# Altium footprint library ST封装.PcbLib: 1336 footprints (part 90 of 109) (continued)
## SQFP40X40-512(T) [mm] (continued)
  oval 1.6x0.2 smd: 65(-20.55,-1.65) 66(-20.55,-1.95) 67(-20.55,-2.25) 68(-20.55,-2.55) 69(-20.55,-2.85) 70(-20.55,-3.15) 71(-20.55,-3.45) 72(-20.55,-3.75) 73(-20.55,-4.05) 74(-20.55,-4.35) 75(-20.55,-4.65) 76(-20.55,-4.95) 77(-20.55,-5.25) 78(-20.55,-5.55) 79(-20.55,-5.85) 80(-20.55,-6.15) 81(-20.55,-6.45) 82(-20.55,-6.75) 83(-20.55,-7.05) 84(-20.55,-7.35) 85(-20.55,-7.65) 86(-20.55,-7.95) 87(-20.55,-8.25) 88(-20.55,-8.55) 89(-20.55,-8.85) 90(-20.55,-9.15) 91(-20.55,-9.45) 92(-20.55,-9.75) 93(-20.55,-10.05) 94(-20.55,-10.35) 95(-20.55,-10.65) 96(-20.55,-10.95) 97(-20.55,-11.25) 98(-20.55,-11.55) 99(-20.55,-11.85) 100(-20.55,-12.15) 101(-20.55,-12.45) 102(-20.55,-12.75) 103(-20.55,-13.05) 104(-20.55,-13.35) 105(-20.55,-13.65) 106(-20.55,-13.95) 107(-20.55,-14.25) 108(-20.55,-14.55) 109(-20.55,-14.85) 110(-20.55,-15.15) 111(-20.55,-15.45) 112(-20.55,-15.75) 113(-20.55,-16.05) 114(-20.55,-16.35) 115(-20.55,-16.65) 116(-20.55,-16.95) 117(-20.55,-17.25) 118(-20.55,-17.55) 119(-20.55,-17.85) 120(-20.55,-18.15) 121(-20.55,-18.45) 122(-20.55,-18.75) 123(-20.55,-19.05) 124(-20.55,-19.35) 125(-20.55,-19.65) 126(-20.55,-19.95) 127(-20.55,-20.25) 128(-20.55,-20.55) 129(-20.55,-20.85) 130(-20.55,-21.15) 131(-20.55,-21.45) 132(-20.55,-21.75) 133(-20.55,-22.05) 134(-20.55,-22.35) 135(-20.55,-22.65) 136(-20.55,-22.95) 137(-20.55,-23.25) 138(-20.55,-23.55) 139(-20.55,-23.85) 140(-20.55,-24.15) 141(-20.55,-24.45) 142(-20.55,-24.75) 143(-20.55,-25.05) 144(-20.55,-25.35) 145(-20.55,-25.65) 146(-20.55,-25.95) 147(-20.55,-26.25) 148(-20.55,-26.55) 149(-20.55,-26.85) 150(-20.55,-27.15) 151(-20.55,-27.45) 152(-20.55,-27.75) 153(-20.55,-28.05) 154(-20.55,-28.35) 155(-20.55,-28.65) 156(-20.55,-28.95) 157(-20.55,-29.25) 158(-20.55,-29.55) 159(-20.55,-29.85) 160(-20.55,-30.15) 161(-20.55,-30.45) 162(-20.55,-30.75) 163(-20.55,-31.05) 164(-20.55,-31.35) 165(-20.55,-31.65) 166(-20.55,-31.95) 167(-20.55,-32.25) 168(-20.55,-32.55) 169(-20.55,-32.85) 170(-20.55,-33.15) 171(-20.55,-33.45) 172(-20.55,-33.75) 173(-20.55,-34.05) 174(-20.55,-34.35) 175(-20.55,-34.65) 176(-20.55,-34.95) 177(-20.55,-35.25) 178(-20.55,-35.55) 179(-20.55,-35.85) 180(-20.55,-36.15) 181(-20.55,-36.45) 182(-20.55,-36.75) 183(-20.55,-37.05) 184(-20.55,-37.35) 185(-20.55,-37.65) 186(-20.55,-37.95) 187(-20.55,-38.25) 188(-20.55,-38.55) 189(-20.55,-38.85) 190(-20.55,-39.15) 191(-20.55,-39.45) 192(-20.55,-39.75) 321(20.85,-39.75) 322(20.85,-39.45) 323(20.85,-39.15) 324(20.85,-38.85) 325(20.85,-38.55) 326(20.85,-38.25) 327(20.85,-37.95) 328(20.85,-37.65) 329(20.85,-37.35) 330(20.85,-37.05) 331(20.85,-36.75) 332(20.85,-36.45) 333(20.85,-36.15) 334(20.85,-35.85) 335(20.85,-35.55) 336(20.85,-35.25) 337(20.85,-34.95) 338(20.85,-34.65) 339(20.85,-34.35) 340(20.85,-34.05) 341(20.85,-33.75) 342(20.85,-33.45) 343(20.85,-33.15) 344(20.85,-32.85) 345(20.85,-32.55) 346(20.85,-32.25) 347(20.85,-31.95) 348(20.85,-31.65) 349(20.85,-31.35) 350(20.85,-31.05) 351(20.85,-30.75) 352(20.85,-30.45) 353(20.85,-30.15) 354(20.85,-29.85) 355(20.85,-29.55) 356(20.85,-29.25) 357(20.85,-28.95) 358(20.85,-28.65) 359(20.85,-28.35) 360(20.85,-28.05) 361(20.85,-27.75) 362(20.85,-27.45) 363(20.85,-27.15) 364(20.85,-26.85) 365(20.85,-26.55) 366(20.85,-26.25) 367(20.85,-25.95) 368(20.85,-25.65) 369(20.85,-25.35) 370(20.85,-25.05) 371(20.85,-24.75) 372(20.85,-24.45) 373(20.85,-24.15) 374(20.85,-23.85) 375(20.85,-23.55) 376(20.85,-23.25) 377(20.85,-22.95) 378(20.85,-22.65) 379(20.85,-22.35) 380(20.85,-22.05) 381(20.85,-21.75) 382(20.85,-21.45) 383(20.85,-21.15) 384(20.85,-20.85) 385(20.85,-20.55) 386(20.85,-20.25) 387(20.85,-19.95) 388(20.85,-19.65) 389(20.85,-19.35) 390(20.85,-19.05) 391(20.85,-18.75) 392(20.85,-18.45) 393(20.85,-18.15) 394(20.85,-17.85) 395(20.85,-17.55) 396(20.85,-17.25) 397(20.85,-16.95) 398(20.85,-16.65) 399(20.85,-16.35) 400(20.85,-16.05) 401(20.85,-15.75) 402(20.85,-15.45) 403(20.85,-15.15) 404(20.85,-14.85) 405(20.85,-14.55) 406(20.85,-14.25) 407(20.85,-13.95) 408(20.85,-13.65) 409(20.85,-13.35) 410(20.85,-13.05) 411(20.85,-12.75) 412(20.85,-12.45) 413(20.85,-12.15) 414(20.85,-11.85) 415(20.85,-11.55) 416(20.85,-11.25) 417(20.85,-10.95) 418(20.85,-10.65) 419(20.85,-10.35) 420(20.85,-10.05) 421(20.85,-9.75) 422(20.85,-9.45) 423(20.85,-9.15) 424(20.85,-8.85) 425(20.85,-8.55) 426(20.85,-8.25) 427(20.85,-7.95) 428(20.85,-7.65) 429(20.85,-7.35) 430(20.85,-7.05) 431(20.85,-6.75) 432(20.85,-6.45) 433(20.85,-6.15) 434(20.85,-5.85) 435(20.85,-5.55) 436(20.85,-5.25) 437(20.85,-4.95) 438(20.85,-4.65) 439(20.85,-4.35) 440(20.85,-4.05) 441(20.85,-3.75) 442(20.85,-3.45) 443(20.85,-3.15) 444(20.85,-2.85) 445(20.85,-2.55) 446(20.85,-2.25) 447(20.85,-1.95) 448(20.85,-1.65)
Top Overlay:
  lines w0.2: -20.95,-40.35 -20.95,-41.8 -19.5,-41.8 ; -20.95,-1.05 -20.95,-0.4 -20.15,0.4 -19.5,0.4 ; 19.8,-41.8 21.25,-41.8 21.25,-40.35 ; 19.8,0.4 21.25,0.4 21.25,-1.05

## SQFP40X40-520(N) [mm]
pads (520):
  rect 1.6x0.2 smd: 1(0,0)
  oval 1.6x0.2 smd: 2(0,-0.3) 3(0,-0.6) 4(0,-0.9) 5(0,-1.2) 6(0,-1.5) 7(0,-1.8) 8(0,-2.1) 9(0,-2.4) 10(0,-2.7) 11(0,-3) 12(0,-3.3) 13(0,-3.6) 14(0,-3.9) 15(0,-4.2) 16(0,-4.5) 17(0,-4.8) 18(0,-5.1) 19(0,-5.4) 20(0,-5.7) 21(0,-6) 22(0,-6.3) 23(0,-6.6) 24(0,-6.9) 25(0,-7.2) 26(0,-7.5) 27(0,-7.8) 28(0,-8.1) 29(0,-8.4) 30(0,-8.7) 31(0,-9) 32(0,-9.3) 33(0,-9.6) 34(0,-9.9) 35(0,-10.2) 36(0,-10.5) 37(0,-10.8) 38(0,-11.1) 39(0,-11.4) 40(0,-11.7) 41(0,-12) 42(0,-12.3) 43(0,-12.6) 44(0,-12.9) 45(0,-13.2) 46(0,-13.5) 47(0,-13.8) 48(0,-14.1) 49(0,-14.4) 50(0,-14.7) 51(0,-15) 52(0,-15.3) 53(0,-15.6) 54(0,-15.9) 55(0,-16.2) 56(0,-16.5) 57(0,-16.8) 58(0,-17.1) 59(0,-17.4) 60(0,-17.7) 61(0,-18) 62(0,-18.3) 63(0,-18.6) 64(0,-18.9) 65(0,-19.2) 66(0,-19.5) 67(0,-19.8) 68(0,-20.1) 69(0,-20.4) 70(0,-20.7) 71(0,-21) 72(0,-21.3) 73(0,-21.6) 74(0,-21.9) 75(0,-22.2) 76(0,-22.5) 77(0,-22.8) 78(0,-23.1) 79(0,-23.4) 80(0,-23.7) 81(0,-24) 82(0,-24.3) 83(0,-24.6) 84(0,-24.9) 85(0,-25.2) 86(0,-25.5) 87(0,-25.8) 88(0,-26.1) 89(0,-26.4) 90(0,-26.7) 91(0,-27) 92(0,-27.3) 93(0,-27.6) 94(0,-27.9) 95(0,-28.2) 96(0,-28.5) 97(0,-28.8) 98(0,-29.1) 99(0,-29.4) 100(0,-29.7) 101(0,-30) 102(0,-30.3) 103(0,-30.6) 104(0,-30.9) 105(0,-31.2) 106(0,-31.5) 107(0,-31.8) 108(0,-32.1) 109(0,-32.4) 110(0,-32.7) 111(0,-33) 112(0,-33.3) 113(0,-33.6) 114(0,-33.9) 115(0,-34.2) 116(0,-34.5) 117(0,-34.8) 118(0,-35.1) 119(0,-35.4) 120(0,-35.7) 121(0,-36) 122(0,-36.3) 123(0,-36.6) 124(0,-36.9) 125(0,-37.2) 126(0,-37.5) 127(0,-37.8) 128(0,-38.1) 129(0,-38.4) 130(0,-38.7) 261(41.4,-38.7) 262(41.4,-38.4) 263(41.4,-38.1) 264(41.4,-37.8) 265(41.4,-37.5) 266(41.4,-37.2) 267(41.4,-36.9) 268(41.4,-36.6) 269(41.4,-36.3) 270(41.4,-36) 271(41.4,-35.7) 272(41.4,-35.4) 273(41.4,-35.1) 274(41.4,-34.8) 275(41.4,-34.5) 276(41.4,-34.2) 277(41.4,-33.9) 278(41.4,-33.6) 279(41.4,-33.3) 280(41.4,-33) 281(41.4,-32.7) 282(41.4,-32.4) 283(41.4,-32.1) 284(41.4,-31.8) 285(41.4,-31.5) 286(41.4,-31.2) 287(41.4,-30.9) 288(41.4,-30.6) 289(41.4,-30.3) 290(41.4,-30) 291(41.4,-29.7) 292(41.4,-29.4) 293(41.4,-29.1) 294(41.4,-28.8) 295(41.4,-28.5) 296(41.4,-28.2) 297(41.4,-27.9) 298(41.4,-27.6) 299(41.4,-27.3) 300(41.4,-27) 301(41.4,-26.7) 302(41.4,-26.4) 303(41.4,-26.1) 304(41.4,-25.8) 305(41.4,-25.5) 306(41.4,-25.2) 307(41.4,-24.9) 308(41.4,-24.6) 309(41.4,-24.3) 310(41.4,-24) 311(41.4,-23.7) 312(41.4,-23.4) 313(41.4,-23.1) 314(41.4,-22.8) 315(41.4,-22.5) 316(41.4,-22.2) 317(41.4,-21.9) 318(41.4,-21.6) 319(41.4,-21.3) 320(41.4,-21) 321(41.4,-20.7) 322(41.4,-20.4) 323(41.4,-20.1) 324(41.4,-19.8) 325(41.4,-19.5) 326(41.4,-19.2) 327(41.4,-18.9) 328(41.4,-18.6) 329(41.4,-18.3) 330(41.4,-18) 331(41.4,-17.7) 332(41.4,-17.4) 333(41.4,-17.1) 334(41.4,-16.8) 335(41.4,-16.5) 336(41.4,-16.2) 337(41.4,-15.9) 338(41.4,-15.6) 339(41.4,-15.3) 340(41.4,-15) 341(41.4,-14.7) 342(41.4,-14.4) 343(41.4,-14.1) 344(41.4,-13.8) 345(41.4,-13.5) 346(41.4,-13.2) 347(41.4,-12.9) 348(41.4,-12.6) 349(41.4,-12.3) 350(41.4,-12) 351(41.4,-11.7) 352(41.4,-11.4) 353(41.4,-11.1) 354(41.4,-10.8) 355(41.4,-10.5) 356(41.4,-10.2) 357(41.4,-9.9) 358(41.4,-9.6) 359(41.4,-9.3) 360(41.4,-9) 361(41.4,-8.7) 362(41.4,-8.4) 363(41.4,-8.1) 364(41.4,-7.8) 365(41.4,-7.5) 366(41.4,-7.2) 367(41.4,-6.9) 368(41.4,-6.6) 369(41.4,-6.3) 370(41.4,-6) 371(41.4,-5.7) 372(41.4,-5.4) 373(41.4,-5.1) 374(41.4,-4.8) 375(41.4,-4.5) 376(41.4,-4.2) 377(41.4,-3.9) 378(41.4,-3.6) 379(41.4,-3.3) 380(41.4,-3) 381(41.4,-2.7) 382(41.4,-2.4) 383(41.4,-2.1) 384(41.4,-1.8) 385(41.4,-1.5) 386(41.4,-1.2) 387(41.4,-0.9) 388(41.4,-0.6) 389(41.4,-0.3) 390(41.4,0)
  oval 0.2x1.6 smd: 131(1.35,-40.05) 132(1.65,-40.05) 133(1.95,-40.05) 134(2.25,-40.05) 135(2.55,-40.05) 136(2.85,-40.05) 137(3.15,-40.05) 138(3.45,-40.05) 139(3.75,-40.05) 140(4.05,-40.05) 141(4.35,-40.05) 142(4.65,-40.05) 143(4.95,-40.05) 144(5.25,-40.05) 145(5.55,-40.05) 146(5.85,-40.05) 147(6.15,-40.05) 148(6.45,-40.05) 149(6.75,-40.05) 150(7.05,-40.05) 151(7.35,-40.05) 152(7.65,-40.05) 153(7.95,-40.05) 154(8.25,-40.05) 155(8.55,-40.05) 156(8.85,-40.05) 157(9.15,-40.05) 158(9.45,-40.05) 159(9.75,-40.05) 160(10.05,-40.05) 161(10.35,-40.05) 162(10.65,-40.05) 163(10.95,-40.05) 164(11.25,-40.05) 165(11.55,-40.05) 166(11.85,-40.05) 167(12.15,-40.05) 168(12.45,-40.05) 169(12.75,-40.05) 170(13.05,-40.05) 171(13.35,-40.05) 172(13.65,-40.05) 173(13.95,-40.05) 174(14.25,-40.05) 175(14.55,-40.05) 176(14.85,-40.05) 177(15.15,-40.05) 178(15.45,-40.05) 179(15.75,-40.05) 180(16.05,-40.05) 181(16.35,-40.05) 182(16.65,-40.05) 183(16.95,-40.05) 184(17.25,-40.05) 185(17.55,-40.05) 186(17.85,-40.05) 187(18.15,-40.05) 188(18.45,-40.05) 189(18.75,-40.05) 190(19.05,-40.05) 191(19.35,-40.05) 192(19.65,-40.05) 193(19.95,-40.05) 194(20.25,-40.05) 195(20.55,-40.05) 196(20.85,-40.05) 197(21.15,-40.05) 198(21.45,-40.05) 199(21.75,-40.05) 200(22.05,-40.05) 201(22.35,-40.05) 202(22.65,-40.05) 203(22.95,-40.05) 204(23.25,-40.05) 205(23.55,-40.05) 206(23.85,-40.05) 207(24.15,-40.05) 208(24.45,-40.05) 209(24.75,-40.05) 210(25.05,-40.05) 211(25.35,-40.05) 212(25.65,-40.05) 213(25.95,-40.05) 214(26.25,-40.05) 215(26.55,-40.05) 216(26.85,-40.05) 217(27.15,-40.05) 218(27.45,-40.05) 219(27.75,-40.05) 220(28.05,-40.05) 221(28.35,-40.05) 222(28.65,-40.05) 223(28.95,-40.05) 224(29.25,-40.05) 225(29.55,-40.05) 226(29.85,-40.05) 227(30.15,-40.05) 228(30.45,-40.05) 229(30.75,-40.05) 230(31.05,-40.05) 231(31.35,-40.05) 232(31.65,-40.05) 233(31.95,-40.05) 234(32.25,-40.05) 235(32.55,-40.05) 236(32.85,-40.05) 237(33.15,-40.05) 238(33.45,-40.05) 239(33.75,-40.05) 240(34.05,-40.05) 241(34.35,-40.05) 242(34.65,-40.05) 243(34.95,-40.05) 244(35.25,-40.05) 245(35.55,-40.05) 246(35.85,-40.05) 247(36.15,-40.05) 248(36.45,-40.05) 249(36.75,-40.05) 250(37.05,-40.05) 251(37.35,-40.05) 252(37.65,-40.05) 253(37.95,-40.05) 254(38.25,-40.05) 255(38.55,-40.05) 256(38.85,-40.05) 257(39.15,-40.05) 258(39.45,-40.05) 259(39.75,-40.05) 260(40.05,-40.05) 391(40.05,1.35) 392(39.75,1.35) 393(39.45,1.35) 394(39.15,1.35) 395(38.85,1.35) 396(38.55,1.35) 397(38.25,1.35) 398(37.95,1.35) 399(37.65,1.35) 400(37.35,1.35) 401(37.05,1.35) 402(36.75,1.35) 403(36.45,1.35) 404(36.15,1.35) 405(35.85,1.35) 406(35.55,1.35) 407(35.25,1.35) 408(34.95,1.35) 409(34.65,1.35) 410(34.35,1.35) 411(34.05,1.35) 412(33.75,1.35) 413(33.45,1.35) 414(33.15,1.35) 415(32.85,1.35) 416(32.55,1.35) 417(32.25,1.35) 418(31.95,1.35) 419(31.65,1.35) 420(31.35,1.35) 421(31.05,1.35) 422(30.75,1.35) 423(30.45,1.35) 424(30.15,1.35) 425(29.85,1.35) 426(29.55,1.35) 427(29.25,1.35) 428(28.95,1.35) 429(28.65,1.35) 430(28.35,1.35) 431(28.05,1.35) 432(27.75,1.35) 433(27.45,1.35) 434(27.15,1.35) 435(26.85,1.35) 436(26.55,1.35) 437(26.25,1.35) 438(25.95,1.35) 439(25.65,1.35) 440(25.35,1.35) 441(25.05,1.35) 442(24.75,1.35) 443(24.45,1.35) 444(24.15,1.35) 445(23.85,1.35) 446(23.55,1.35) 447(23.25,1.35) 448(22.95,1.35) 449(22.65,1.35) 450(22.35,1.35) 451(22.05,1.35) 452(21.75,1.35) 453(21.45,1.35) 454(21.15,1.35) 455(20.85,1.35) 456(20.55,1.35) 457(20.25,1.35) 458(19.95,1.35) 459(19.65,1.35) 460(19.35,1.35) 461(19.05,1.35) 462(18.75,1.35) 463(18.45,1.35) 464(18.15,1.35) 465(17.85,1.35) 466(17.55,1.35) 467(17.25,1.35) 468(16.95,1.35) 469(16.65,1.35) 470(16.35,1.35) 471(16.05,1.35) 472(15.75,1.35) 473(15.45,1.35) 474(15.15,1.35) 475(14.85,1.35) 476(14.55,1.35) 477(14.25,1.35) 478(13.95,1.35) 479(13.65,1.35) 480(13.35,1.35) 481(13.05,1.35) 482(12.75,1.35) 483(12.45,1.35) 484(12.15,1.35) 485(11.85,1.35) 486(11.55,1.35) 487(11.25,1.35) 488(10.95,1.35) 489(10.65,1.35) 490(10.35,1.35) 491(10.05,1.35) 492(9.75,1.35) 493(9.45,1.35) 494(9.15,1.35) 495(8.85,1.35) 496(8.55,1.35) 497(8.25,1.35) 498(7.95,1.35) 499(7.65,1.35) 500(7.35,1.35) 501(7.05,1.35) 502(6.75,1.35) 503(6.45,1.35) 504(6.15,1.35) 505(5.85,1.35) 506(5.55,1.35) 507(5.25,1.35) 508(4.95,1.35) 509(4.65,1.35) 510(4.35,1.35) 511(4.05,1.35) 512(3.75,1.35) 513(3.45,1.35) 514(3.15,1.35) 515(2.85,1.35) 516(2.55,1.35) 517(2.25,1.35) 518(1.95,1.35) 519(1.65,1.35) 520(1.35,1.35)
Top Overlay:
  lines w0.2: -0.4,-39.3 -0.4,-40.45 0.75,-40.45 ; -0.4,0.6 -0.4,0.95 0.4,1.75 0.75,1.75 ; 40.65,-40.45 41.8,-40.45 41.8,-39.3 ; 40.65,1.75 41.8,1.75 41.8,0.6

## SQFP40X40-520(T) [mm]
pads (520):
  rect 0.2x1.6 smd: 1(0,0)
  oval 0.2x1.6 smd: 2(-0.3,0) 3(-0.6,0) 4(-0.9,0) 5(-1.2,0) 6(-1.5,0) 7(-1.8,0) 8(-2.1,0) 9(-2.4,0) 10(-2.7,0) 11(-3,0) 12(-3.3,0) 13(-3.6,0) 14(-3.9,0) 15(-4.2,0) 16(-4.5,0) 17(-4.8,0) 18(-5.1,0) 19(-5.4,0) 20(-5.7,0) 21(-6,0) 22(-6.3,0) 23(-6.6,0) 24(-6.9,0) 25(-7.2,0) 26(-7.5,0) 27(-7.8,0) 28(-8.1,0) 29(-8.4,0) 30(-8.7,0) 31(-9,0) 32(-9.3,0) 33(-9.6,0) 34(-9.9,0) 35(-10.2,0) 36(-10.5,0) 37(-10.8,0) 38(-11.1,0) 39(-11.4,0) 40(-11.7,0) 41(-12,0) 42(-12.3,0) 43(-12.6,0) 44(-12.9,0) 45(-13.2,0) 46(-13.5,0) 47(-13.8,0) 48(-14.1,0) 49(-14.4,0) 50(-14.7,0) 51(-15,0) 52(-15.3,0) 53(-15.6,0) 54(-15.9,0) 55(-16.2,0) 56(-16.5,0) 57(-16.8,0) 58(-17.1,0) 59(-17.4,0) 60(-17.7,0) 61(-18,0) 62(-18.3,0) 63(-18.6,0) 64(-18.9,0) 65(-19.2,0) 196(-19.2,-41.4) 197(-18.9,-41.4) 198(-18.6,-41.4) 199(-18.3,-41.4) 200(-18,-41.4) 201(-17.7,-41.4) 202(-17.4,-41.4) 203(-17.1,-41.4) 204(-16.8,-41.4) 205(-16.5,-41.4) 206(-16.2,-41.4) 207(-15.9,-41.4) 208(-15.6,-41.4) 209(-15.3,-41.4) 210(-15,-41.4) 211(-14.7,-41.4) 212(-14.4,-41.4) 213(-14.1,-41.4) 214(-13.8,-41.4) 215(-13.5,-41.4) 216(-13.2,-41.4) 217(-12.9,-41.4) 218(-12.6,-41.4) 219(-12.3,-41.4) 220(-12,-41.4) 221(-11.7,-41.4) 222(-11.4,-41.4) 223(-11.1,-41.4) 224(-10.8,-41.4) 225(-10.5,-41.4) 226(-10.2,-41.4) 227(-9.9,-41.4) 228(-9.6,-41.4) 229(-9.3,-41.4) 230(-9,-41.4) 231(-8.7,-41.4) 232(-8.4,-41.4) 233(-8.1,-41.4) 234(-7.8,-41.4) 235(-7.5,-41.4) 236(-7.2,-41.4) 237(-6.9,-41.4) 238(-6.6,-41.4) 239(-6.3,-41.4) 240(-6,-41.4) 241(-5.7,-41.4) 242(-5.4,-41.4) 243(-5.1,-41.4) 244(-4.8,-41.4) 245(-4.5,-41.4) 246(-4.2,-41.4) 247(-3.9,-41.4) 248(-3.6,-41.4) 249(-3.3,-41.4) 250(-3,-41.4) 251(-2.7,-41.4) 252(-2.4,-41.4) 253(-2.1,-41.4) 254(-1.8,-41.4) 255(-1.5,-41.4) 256(-1.2,-41.4) 257(-0.9,-41.4) 258(-0.6,-41.4) 259(-0.3,-41.4) 260(0,-41.4) 261(0.3,-41.4) 262(0.6,-41.4) 263(0.9,-41.4) 264(1.2,-41.4) 265(1.5,-41.4) 266(1.8,-41.4) 267(2.1,-41.4) 268(2.4,-41.4) 269(2.7,-41.4) 270(3,-41.4) 271(3.3,-41.4) 272(3.6,-41.4) 273(3.9,-41.4) 274(4.2,-41.4) 275(4.5,-41.4) 276(4.8,-41.4) 277(5.1,-41.4) 278(5.4,-41.4) 279(5.7,-41.4) 280(6,-41.4) 281(6.3,-41.4) 282(6.6,-41.4) 283(6.9,-41.4) 284(7.2,-41.4) 285(7.5,-41.4) 286(7.8,-41.4) 287(8.1,-41.4) 288(8.4,-41.4) 289(8.7,-41.4) 290(9,-41.4) 291(9.3,-41.4) 292(9.6,-41.4) 293(9.9,-41.4) 294(10.2,-41.4) 295(10.5,-41.4) 296(10.8,-41.4) 297(11.1,-41.4) 298(11.4,-41.4) 299(11.7,-41.4) 300(12,-41.4) 301(12.3,-41.4) 302(12.6,-41.4) 303(12.9,-41.4) 304(13.2,-41.4) 305(13.5,-41.4) 306(13.8,-41.4) 307(14.1,-41.4) 308(14.4,-41.4) 309(14.7,-41.4) 310(15,-41.4) 311(15.3,-41.4) 312(15.6,-41.4) 313(15.9,-41.4) 314(16.2,-41.4) 315(16.5,-41.4) 316(16.8,-41.4) 317(17.1,-41.4) 318(17.4,-41.4) 319(17.7,-41.4) 320(18,-41.4) 321(18.3,-41.4) 322(18.6,-41.4) 323(18.9,-41.4) 324(19.2,-41.4) 325(19.5,-41.4) 456(19.5,0) 457(19.2,0) 458(18.9,0) 459(18.6,0) 460(18.3,0) 461(18,0) 462(17.7,0) 463(17.4,0) 464(17.1,0) 465(16.8,0) 466(16.5,0) 467(16.2,0) 468(15.9,0) 469(15.6,0) 470(15.3,0) 471(15,0) 472(14.7,0) 473(14.4,0) 474(14.1,0) 475(13.8,0) 476(13.5,0) 477(13.2,0) 478(12.9,0) 479(12.6,0) 480(12.3,0) 481(12,0) 482(11.7,0) 483(11.4,0) 484(11.1,0) 485(10.8,0) 486(10.5,0) 487(10.2,0) 488(9.9,0) 489(9.6,0) 490(9.3,0) 491(9,0) 492(8.7,0) 493(8.4,0) 494(8.1,0) 495(7.8,0) 496(7.5,0) 497(7.2,0) 498(6.9,0) 499(6.6,0) 500(6.3,0) 501(6,0) 502(5.7,0) 503(5.4,0) 504(5.1,0) 505(4.8,0) 506(4.5,0) 507(4.2,0) 508(3.9,0) 509(3.6,0) 510(3.3,0) 511(3,0) 512(2.7,0) 513(2.4,0) 514(2.1,0) 515(1.8,0) 516(1.5,0) 517(1.2,0) 518(0.9,0) 519(0.6,0) 520(0.3,0)
  oval 1.6x0.2 smd: 66(-20.55,-1.35) 67(-20.55,-1.65) 68(-20.55,-1.95) 69(-20.55,-2.25) 70(-20.55,-2.55) 71(-20.55,-2.85) 72(-20.55,-3.15) 73(-20.55,-3.45) 74(-20.55,-3.75) 75(-20.55,-4.05) 76(-20.55,-4.35) 77(-20.55,-4.65) 78(-20.55,-4.95) 79(-20.55,-5.25) 80(-20.55,-5.55) 81(-20.55,-5.85) 82(-20.55,-6.15) 83(-20.55,-6.45) 84(-20.55,-6.75) 85(-20.55,-7.05) 86(-20.55,-7.35) 87(-20.55,-7.65) 88(-20.55,-7.95) 89(-20.55,-8.25) 90(-20.55,-8.55) 91(-20.55,-8.85) 92(-20.55,-9.15) 93(-20.55,-9.45) 94(-20.55,-9.75) 95(-20.55,-10.05) 96(-20.55,-10.35) 97(-20.55,-10.65) 98(-20.55,-10.95) 99(-20.55,-11.25) 100(-20.55,-11.55) 101(-20.55,-11.85) 102(-20.55,-12.15) 103(-20.55,-12.45) 104(-20.55,-12.75) 105(-20.55,-13.05) 106(-20.55,-13.35) 107(-20.55,-13.65) 108(-20.55,-13.95) 109(-20.55,-14.25) 110(-20.55,-14.55) 111(-20.55,-14.85) 112(-20.55,-15.15) 113(-20.55,-15.45) 114(-20.55,-15.75) 115(-20.55,-16.05) 116(-20.55,-16.35) 117(-20.55,-16.65) 118(-20.55,-16.95) 119(-20.55,-17.25) 120(-20.55,-17.55) 121(-20.55,-17.85) 122(-20.55,-18.15) 123(-20.55,-18.45) 124(-20.55,-18.75) 125(-20.55,-19.05) 126(-20.55,-19.35) 127(-20.55,-19.65) 128(-20.55,-19.95) 129(-20.55,-20.25) 130(-20.55,-20.55) 131(-20.55,-20.85) 132(-20.55,-21.15) 133(-20.55,-21.45) 134(-20.55,-21.75) 135(-20.55,-22.05) 136(-20.55,-22.35) 137(-20.55,-22.65) 138(-20.55,-22.95) 139(-20.55,-23.25) 140(-20.55,-23.55) 141(-20.55,-23.85) 142(-20.55,-24.15) 143(-20.55,-24.45) 144(-20.55,-24.75) 145(-20.55,-25.05) 146(-20.55,-25.35) 147(-20.55,-25.65) 148(-20.55,-25.95) 149(-20.55,-26.25) 150(-20.55,-26.55) 151(-20.55,-26.85) 152(-20.55,-27.15) 153(-20.55,-27.45) 154(-20.55,-27.75) 155(-20.55,-28.05) 156(-20.55,-28.35) 157(-20.55,-28.65) 158(-20.55,-28.95) 159(-20.55,-29.25) 160(-20.55,-29.55) 161(-20.55,-29.85) 162(-20.55,-30.15) 163(-20.55,-30.45) 164(-20.55,-30.75) 165(-20.55,-31.05) 166(-20.55,-31.35) 167(-20.55,-31.65) 168(-20.55,-31.95) 169(-20.55,-32.25) 170(-20.55,-32.55) 171(-20.55,-32.85) 172(-20.55,-33.15) 173(-20.55,-33.45) 174(-20.55,-33.75) 175(-20.55,-34.05) 176(-20.55,-34.35) 177(-20.55,-34.65) 178(-20.55,-34.95) 179(-20.55,-35.25) 180(-20.55,-35.55) 181(-20.55,-35.85) 182(-20.55,-36.15) 183(-20.55,-36.45) 184(-20.55,-36.75) 185(-20.55,-37.05) 186(-20.55,-37.35) 187(-20.55,-37.65) 188(-20.55,-37.95) 189(-20.55,-38.25) 190(-20.55,-38.55) 191(-20.55,-38.85) 192(-20.55,-39.15) 193(-20.55,-39.45) 194(-20.55,-39.75) 195(-20.55,-40.05) 326(20.85,-40.05) 327(20.85,-39.75) 328(20.85,-39.45) 329(20.85,-39.15) 330(20.85,-38.85) 331(20.85,-38.55) 332(20.85,-38.25) 333(20.85,-37.95) 334(20.85,-37.65) 335(20.85,-37.35) 336(20.85,-37.05) 337(20.85,-36.75) 338(20.85,-36.45) 339(20.85,-36.15) 340(20.85,-35.85) 341(20.85,-35.55) 342(20.85,-35.25) 343(20.85,-34.95) 344(20.85,-34.65) 345(20.85,-34.35) 346(20.85,-34.05) 347(20.85,-33.75) 348(20.85,-33.45) 349(20.85,-33.15) 350(20.85,-32.85) 351(20.85,-32.55) 352(20.85,-32.25) 353(20.85,-31.95) 354(20.85,-31.65) 355(20.85,-31.35) 356(20.85,-31.05) 357(20.85,-30.75) 358(20.85,-30.45) 359(20.85,-30.15) 360(20.85,-29.85) 361(20.85,-29.55) 362(20.85,-29.25) 363(20.85,-28.95) 364(20.85,-28.65) 365(20.85,-28.35) 366(20.85,-28.05) 367(20.85,-27.75) 368(20.85,-27.45) 369(20.85,-27.15) 370(20.85,-26.85) 371(20.85,-26.55) 372(20.85,-26.25) 373(20.85,-25.95) 374(20.85,-25.65) 375(20.85,-25.35) 376(20.85,-25.05) 377(20.85,-24.75) 378(20.85,-24.45) 379(20.85,-24.15) 380(20.85,-23.85) 381(20.85,-23.55) 382(20.85,-23.25) 383(20.85,-22.95) 384(20.85,-22.65) 385(20.85,-22.35) 386(20.85,-22.05) 387(20.85,-21.75) 388(20.85,-21.45) 389(20.85,-21.15) 390(20.85,-20.85) 391(20.85,-20.55) 392(20.85,-20.25) 393(20.85,-19.95) 394(20.85,-19.65) 395(20.85,-19.35) 396(20.85,-19.05) 397(20.85,-18.75) 398(20.85,-18.45) 399(20.85,-18.15) 400(20.85,-17.85) 401(20.85,-17.55) 402(20.85,-17.25) 403(20.85,-16.95) 404(20.85,-16.65) 405(20.85,-16.35) 406(20.85,-16.05) 407(20.85,-15.75) 408(20.85,-15.45) 409(20.85,-15.15) 410(20.85,-14.85) 411(20.85,-14.55) 412(20.85,-14.25) 413(20.85,-13.95) 414(20.85,-13.65) 415(20.85,-13.35) 416(20.85,-13.05) 417(20.85,-12.75) 418(20.85,-12.45) 419(20.85,-12.15) 420(20.85,-11.85) 421(20.85,-11.55) 422(20.85,-11.25) 423(20.85,-10.95) 424(20.85,-10.65) 425(20.85,-10.35) 426(20.85,-10.05) 427(20.85,-9.75) 428(20.85,-9.45) 429(20.85,-9.15) 430(20.85,-8.85) 431(20.85,-8.55) 432(20.85,-8.25) 433(20.85,-7.95) 434(20.85,-7.65) 435(20.85,-7.35) 436(20.85,-7.05) 437(20.85,-6.75) 438(20.85,-6.45) 439(20.85,-6.15) 440(20.85,-5.85) 441(20.85,-5.55) 442(20.85,-5.25) 443(20.85,-4.95) 444(20.85,-4.65) 445(20.85,-4.35) 446(20.85,-4.05) 447(20.85,-3.75) 448(20.85,-3.45) 449(20.85,-3.15) 450(20.85,-2.85) 451(20.85,-2.55) 452(20.85,-2.25) 453(20.85,-1.95) 454(20.85,-1.65) 455(20.85,-1.35)
Top Overlay:
  lines w0.2: -20.95,-40.65 -20.95,-41.8 -19.8,-41.8 ; -20.95,-0.75 -20.95,-0.4 -20.15,0.4 -19.8,0.4 ; 20.1,-41.8 21.25,-41.8 21.25,-40.65 ; 20.1,0.4 21.25,0.4 21.25,-0.75